# Altium footprint library Ryś_PCB.PcbLib: 22 footprints (part 1 of 2)
Each footprint in its own frame and in the unit in brackets; x right, y up, seen from the top. Pads: shape width x height; smd on the part's side, far side on the other; paste and mask are expansions set on the pad; w line width, h text height; cw(c..) or ccw(c..) is an arc to the next point about the centre after c.
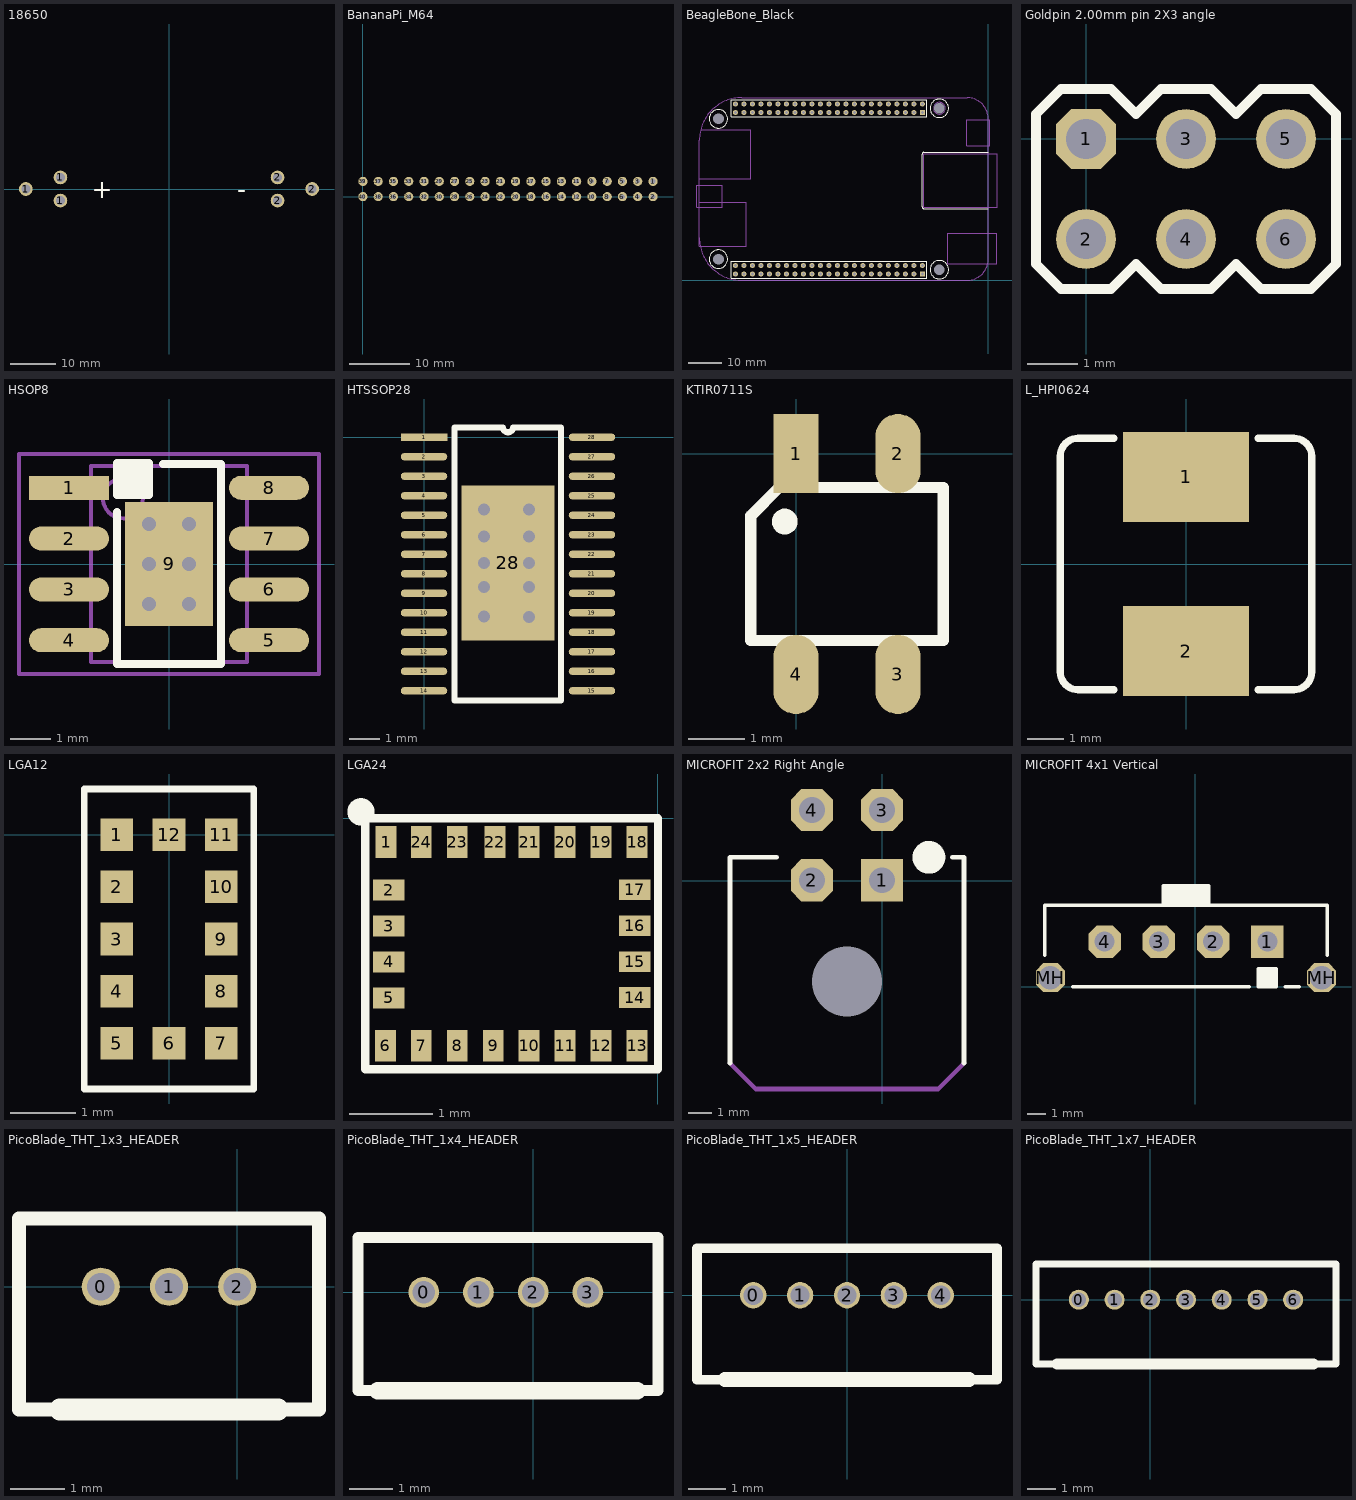
[diagram p0: the footprints below, top view; thin cyan lines are the x and y axes]

## 18650 [mm]
pads (6):
  round 3 hole 2: 1(-31.5,0) 1(-23.88,-2.54) 1(-23.88,2.54) 2(23.88,-2.54) 2(23.88,2.54) 2(31.5,0)
Top Overlay:
  text "+" at -17,-2 h4
  text "-" at 15,-2 h4
3D body "KEYELCO_54.STEP": height 18.16, standoff -3.05, extent 21.913,-9.444 34.92,9.443
3D body "KEYELCO_54.STEP": height 18.16, standoff -3.05, extent -34.92,-9.443 -21.913,9.444

## BananaPi_M64 [mil] "singleboard_computer_40PIN_header"
pads (40):
  round 60 hole 35: 1(1900,100)
  round 60 hole 30: 2(1900,0) 3(1800,100) 4(1800,0) 5(1700,100) 6(1700,0) 7(1600,100) 8(1600,0) 9(1500,100) 10(1500,0) 11(1400,100) 12(1400,0) 13(1300,100) 14(1300,0) 15(1200,100) 16(1200,0) 17(1100,100) 18(1100,0) 19(1000,100) 20(1000,0) 21(900,100) 22(900,0) 23(800,100) 24(800,0) 25(700,100) 26(700,0) 27(600,100) 28(600,0) 29(500,100) 30(500,0) 31(400,100) 32(400,0) 33(300,100) 34(300,0) 35(200,100) 36(200,0) 37(100,100) 38(100,0) 39(0,100) 40(0,0)
Bottom Overlay:
  circle w19.68: c0.16,0.1 r32.5
  circle w19.68: c0.16,100.1 r32.5
  circle w19.68: c100.16,0.1 r32.5
  circle w19.68: c100.16,100.1 r32.5
  circle w19.68: c200.16,0.1 r32.5
  circle w19.68: c200.16,100.1 r32.5
  circle w19.68: c300.16,0.1 r32.5
  circle w19.68: c300.16,100.1 r32.5
  circle w19.68: c400.16,0.1 r32.5
  circle w19.68: c400.16,100.1 r32.5
  circle w19.68: c500.16,0.1 r32.5
  circle w19.68: c500.16,100.1 r32.5
  circle w19.68: c600.16,0.1 r32.5
  circle w19.68: c600.16,100.1 r32.5
  circle w19.68: c700.16,0.1 r32.5
  circle w19.68: c700.16,100.1 r32.5
  circle w19.68: c800.16,0.1 r32.5
  circle w19.68: c800.16,100.1 r32.5
  circle w19.68: c900.16,0.1 r32.5
  circle w19.68: c900.16,100.1 r32.5
  circle w19.68: c1000.16,0.1 r32.5
  circle w19.68: c1000.16,100.1 r32.5
  circle w19.68: c1100.16,0.1 r32.5
  circle w19.68: c1100.16,100.1 r32.5
  circle w19.68: c1200.16,0.1 r32.5
  circle w19.68: c1200.16,100.1 r32.5
  circle w19.68: c1300.16,0.1 r32.5
  circle w19.68: c1300.16,100.1 r32.5
  circle w19.68: c1400.16,0.1 r32.5
  circle w19.68: c1400.16,100.1 r32.5
  circle w19.68: c1500.16,0.1 r32.5
  circle w19.68: c1500.16,100.1 r32.5
  circle w19.68: c1600.16,0.1 r32.5
  circle w19.68: c1600.16,100.1 r32.5
  circle w19.68: c1700.16,0.1 r32.5
  circle w19.68: c1700.16,100.1 r32.5
  circle w19.68: c1800.16,0.1 r32.5
  circle w19.68: c1800.16,100.1 r32.5
  circle w19.68: c1900.16,0.1 r32.5
  lines w19.68: 1867.66,67.6 1932.66,67.6 1932.66,132.6 1867.66,132.6 1867.66,67.6
3D body "bpi-m64.STEP": height 195.91, standoff -592.14, extent -1308.33,-125.17 2527.56,2345.64
3D body "User Library-PBD2_54-40.step": height 92.52, standoff -344.49, extent -49.21,-49.21 1950.79,150.79

## BeagleBone_Black [mm]
pads (96):
  round 2 hole 3.2 unplated: MH(-80.645,6.35) MH(-80.645,48.26) MH(-14.605,3.175) MH(-14.605,51.435)
  rect 1.5x1.5 hole 0.9 mask+0.051: P8_1(-19.685,50.165) P9_1(-19.685,1.905)
  round 1.5 hole 0.9 mask+0.051: P8_2(-19.685,52.705) P8_3(-22.225,50.165) P8_4(-22.225,52.705) P8_5(-24.765,50.165) P8_6(-24.765,52.705) P8_7(-27.305,50.165) P8_8(-27.305,52.705) P8_9(-29.845,50.165) P8_10(-29.845,52.705) P8_11(-32.385,50.165) P8_12(-32.385,52.705) P8_13(-34.925,50.165) P8_14(-34.925,52.705) P8_15(-37.465,50.165) P8_16(-37.465,52.705) P8_17(-40.005,50.165) P8_18(-40.005,52.705) P8_19(-42.545,50.165) P8_20(-42.545,52.705) P8_21(-45.085,50.165) P8_22(-45.085,52.705) P8_23(-47.625,50.165) P8_24(-47.625,52.705) P8_25(-50.165,50.165) P8_26(-50.165,52.705) P8_27(-52.705,50.165) P8_28(-52.705,52.705) P8_29(-55.245,50.165) P8_30(-55.245,52.705) P8_31(-57.785,50.165) P8_32(-57.785,52.705) P8_33(-60.325,50.165) P8_34(-60.325,52.705) P8_35(-62.865,50.165) P8_36(-62.865,52.705) P8_37(-65.405,50.165) P8_38(-65.405,52.705) P8_39(-67.945,50.165) P8_40(-67.945,52.705) P8_41(-70.485,50.165) P8_42(-70.485,52.705) P8_43(-73.025,50.165) P8_44(-73.025,52.705) P8_45(-75.565,50.165) P8_46(-75.565,52.705) P9_2(-19.685,4.445) P9_3(-22.225,1.905) P9_4(-22.225,4.445) P9_5(-24.765,1.905) P9_6(-24.765,4.445) P9_7(-27.305,1.905) P9_8(-27.305,4.445) P9_9(-29.845,1.905) P9_10(-29.845,4.445) P9_11(-32.385,1.905) P9_12(-32.385,4.445) P9_13(-34.925,1.905) P9_14(-34.925,4.445) P9_15(-37.465,1.905) P9_16(-37.465,4.445) P9_17(-40.005,1.905) P9_18(-40.005,4.445) P9_19(-42.545,1.905) P9_20(-42.545,4.445) P9_21(-45.085,1.905) P9_22(-45.085,4.445) P9_23(-47.625,1.905) P9_24(-47.625,4.445) P9_25(-50.165,1.905) P9_26(-50.165,4.445) P9_27(-52.705,1.905) P9_28(-52.705,4.445) P9_29(-55.245,1.905) P9_30(-55.245,4.445) P9_31(-57.785,1.905) P9_32(-57.785,4.445) P9_33(-60.325,1.905) P9_34(-60.325,4.445) P9_35(-62.865,1.905) P9_36(-62.865,4.445) P9_37(-65.405,1.905) P9_38(-65.405,4.445) P9_39(-67.945,1.905) P9_40(-67.945,4.445) P9_41(-70.485,1.905) P9_42(-70.485,4.445) P9_43(-73.025,1.905) P9_44(-73.025,4.445) P9_45(-75.565,1.905) P9_46(-75.565,4.445)
Top Overlay:
  circle w0.2: c-14.605,3.175 r2.75
  circle w0.2: c-80.645,6.35 r2.75
  circle w0.2: c-80.645,48.26 r2.75
  circle w0.2: c-14.605,51.435 r2.75
  lines w0.025: -76.835,0.635 -76.835,5.715 -20.955,5.715 -18.415,5.715 -18.415,0.635 -20.955,0.635 -76.835,0.635 ; -76.835,48.895 -76.835,53.975 -20.955,53.975 -18.415,53.975 -18.415,48.895 -20.955,48.895 -76.835,48.895
  lines w0.1: 0,21.44 -19.25,21.44 cw(c-19.25,21.94) -19.75,21.94 -19.75,37.75 cw(c-19.25,37.75) -19.25,38.25 0,38.25
Bottom Overlay:
  circle w0.2: c-80.645,48.26 r2.75
  circle w0.2: c-80.645,6.35 r2.75
  circle w0.2: c-14.605,3.175 r2.75
  circle w0.2: c-14.605,51.435 r2.75
  text ".Designator" at -79.057,2.54 h1.02
  text ".Designator" at -79.057,50.8 h1.02
Top Solder:
  circle w2.5: c-14.605,3.175 r1.25
  circle w2.5: c-80.645,6.35 r1.25
  circle w2.5: c-80.645,48.26 r1.25
  circle w2.5: c-14.605,51.435 r1.25
Bottom Solder:
  circle w2.5: c-80.645,48.26 r1.25
  circle w2.5: c-80.645,6.35 r1.25
  circle w2.5: c-14.605,3.175 r1.25
  circle w2.5: c-14.605,51.435 r1.25
Mechanical 9:
  circle w0.005: c-14.605,51.435 r1.75
Mechanical 13:
  lines w0.1: -86.294,30.416 -70.991,30.416 -70.991,45.021 -85.901,45.021 ; -12.065,4.953 -12.065,14.097 ; -12.065,4.953 -0.25,4.953 2.54,4.953 2.54,14.097 0,14.097 ; -12.065,4.953 -12.065,14.097 ; -12.065,14.097 0,14.097 ; -12.065,14.097 0,14.097 ; -87.05,21.896 -87.05,28.396 -79.55,28.396 -79.55,21.896 -87.05,21.896 ; -86.36,12.7 ccw(c-73.66,12.7) -73.66,0 -6.35,0 ccw(c-6.35,6.35) 0,6.35 0,48.26 ccw(c-6.35,48.26) -6.35,54.61 -73.66,54.61 ccw(c-73.66,41.91) -86.36,41.91 -86.36,12.7 ; -86.332,10.264 -72.332,10.264 -72.332,23.365 -86.332,23.365 -86.332,10.264 ; -19.228,21.895 0,21.895 2.616,21.895 2.616,37.795 0,37.795 -19.228,37.795 -19.228,21.895 ; -6.496,40.283 -6.496,47.982 0.504,47.982 0.504,40.283 -6.496,40.283
Multi-Layer:
  drawing of 4 lines, arcs and shapes, not listed
3D body: height 1.5, standoff 0, extent -71.755,0.635 -69.215,5.715
3D body: height 8.6, standoff -3, extent -70.739,4.191 -70.231,4.699
3D body: height 8.6, standoff -3, extent -70.739,1.651 -70.231,2.159
3D body: height 1.5, standoff 0, extent -74.295,0.635 -71.755,5.715
3D body: height 8.6, standoff -3, extent -73.279,4.191 -72.771,4.699
3D body: height 8.6, standoff -3, extent -73.279,1.651 -72.771,2.159
3D body: height 1.5, standoff 0, extent -76.835,0.635 -74.295,5.715
3D body: height 8.6, standoff -3, extent -75.819,4.191 -75.311,4.699
3D body: height 8.6, standoff -3, extent -75.819,1.651 -75.311,2.159
3D body: height 1.5, standoff 0, extent -61.595,0.635 -59.055,5.715
3D body: height 8.6, standoff -3, extent -60.579,4.191 -60.071,4.699
3D body: height 8.6, standoff -3, extent -60.579,1.651 -60.071,2.159
3D body: height 1.5, standoff 0, extent -64.135,0.635 -61.595,5.715
3D body: height 8.6, standoff -3, extent -63.119,4.191 -62.611,4.699
3D body: height 8.6, standoff -3, extent -63.119,1.651 -62.611,2.159
3D body: height 1.5, standoff 0, extent -66.675,0.635 -64.135,5.715
3D body: height 8.6, standoff -3, extent -65.659,4.191 -65.151,4.699
3D body: height 8.6, standoff -3, extent -65.659,1.651 -65.151,2.159
3D body: height 1.5, standoff 0, extent -69.215,0.635 -66.675,5.715
3D body: height 8.6, standoff -3, extent -68.199,4.191 -67.691,4.699
3D body: height 8.6, standoff -3, extent -68.199,1.651 -67.691,2.159
3D body: height 1.5, standoff 0, extent -51.435,0.635 -48.895,5.715
3D body: height 8.6, standoff -3, extent -50.419,4.191 -49.911,4.699
3D body: height 8.6, standoff -3, extent -50.419,1.651 -49.911,2.159
3D body: height 1.5, standoff 0, extent -53.975,0.635 -51.435,5.715
3D body: height 8.6, standoff -3, extent -52.959,4.191 -52.451,4.699
3D body: height 8.6, standoff -3, extent -52.959,1.651 -52.451,2.159
3D body: height 1.5, standoff 0, extent -56.515,0.635 -53.975,5.715
3D body: height 8.6, standoff -3, extent -55.499,4.191 -54.991,4.699
3D body: height 8.6, standoff -3, extent -55.499,1.651 -54.991,2.159
3D body: height 1.5, standoff 0, extent -59.055,0.635 -56.515,5.715
3D body: height 8.6, standoff -3, extent -58.039,4.191 -57.531,4.699
3D body: height 8.6, standoff -3, extent -58.039,1.651 -57.531,2.159
3D body: height 1.5, standoff 0, extent -41.275,0.635 -38.735,5.715
3D body: height 8.6, standoff -3, extent -40.259,4.191 -39.751,4.699
3D body: height 8.6, standoff -3, extent -40.259,1.651 -39.751,2.159
3D body: height 1.5, standoff 0, extent -43.815,0.635 -41.275,5.715
3D body: height 8.6, standoff -3, extent -42.799,4.191 -42.291,4.699
3D body: height 8.6, standoff -3, extent -42.799,1.651 -42.291,2.159
3D body: height 1.5, standoff 0, extent -46.355,0.635 -43.815,5.715
3D body: height 8.6, standoff -3, extent -45.339,4.191 -44.831,4.699
3D body: height 8.6, standoff -3, extent -45.339,1.651 -44.831,2.159
3D body: height 1.5, standoff 0, extent -48.895,0.635 -46.355,5.715
3D body: height 8.6, standoff -3, extent -47.879,4.191 -47.371,4.699
3D body: height 8.6, standoff -3, extent -47.879,1.651 -47.371,2.159
3D body: height 1.5, standoff 0, extent -31.115,0.635 -28.575,5.715
3D body: height 8.6, standoff -3, extent -30.099,4.191 -29.591,4.699
3D body: height 8.6, standoff -3, extent -30.099,1.651 -29.591,2.159
3D body: height 1.5, standoff 0, extent -33.655,0.635 -31.115,5.715
3D body: height 8.6, standoff -3, extent -32.639,4.191 -32.131,4.699
3D body: height 8.6, standoff -3, extent -32.639,1.651 -32.131,2.159
3D body: height 1.5, standoff 0, extent -36.195,0.635 -33.655,5.715
3D body: height 8.6, standoff -3, extent -35.179,4.191 -34.671,4.699
3D body: height 8.6, standoff -3, extent -35.179,1.651 -34.671,2.159
3D body: height 1.5, standoff 0, extent -38.735,0.635 -36.195,5.715
3D body: height 8.6, standoff -3, extent -37.719,4.191 -37.211,4.699
3D body: height 8.6, standoff -3, extent -37.719,1.651 -37.211,2.159
3D body: height 8.6, standoff -3, extent -27.559,1.651 -27.051,2.159
3D body: height 8.6, standoff -3, extent -27.559,4.191 -27.051,4.699
3D body: height 1.5, standoff 0, extent -28.575,0.635 -26.035,5.715
3D body: height 8.6, standoff -3, extent -25.019,1.651 -24.511,2.159
3D body: height 8.6, standoff -3, extent -25.019,4.191 -24.511,4.699
3D body: height 1.5, standoff 0, extent -26.035,0.635 -23.495,5.715
3D body: height 8.6, standoff -3, extent -22.479,1.651 -21.971,2.159
3D body: height 8.6, standoff -3, extent -22.479,4.191 -21.971,4.699
3D body: height 1.5, standoff 0, extent -23.495,0.635 -20.955,5.715
3D body: height 8.6, standoff -3, extent -19.939,1.651 -19.431,2.159
3D body: height 8.6, standoff -3, extent -19.939,4.191 -19.431,4.699
3D body: height 1.5, standoff 0, extent -20.955,0.635 -18.415,5.715
3D body "BEAGLEBONE_BLACK.STEP": height 2.84, standoff -16.53, extent -87.947,-0.003 2.503,54.657
3D body: height 1.5, standoff 0, extent -20.955,48.895 -18.415,53.975
3D body: height 8.6, standoff -3, extent -19.939,52.451 -19.431,52.959
3D body: height 8.6, standoff -3, extent -19.939,49.911 -19.431,50.419
3D body: height 1.5, standoff 0, extent -23.495,48.895 -20.955,53.975
3D body: height 8.6, standoff -3, extent -22.479,52.451 -21.971,52.959
3D body: height 8.6, standoff -3, extent -22.479,49.911 -21.971,50.419
3D body: height 1.5, standoff 0, extent -26.035,48.895 -23.495,53.975
3D body: height 8.6, standoff -3, extent -25.019,52.451 -24.511,52.959
3D body: height 8.6, standoff -3, extent -25.019,49.911 -24.511,50.419
3D body: height 1.5, standoff 0, extent -28.575,48.895 -26.035,53.975
3D body: height 8.6, standoff -3, extent -27.559,52.451 -27.051,52.959
3D body: height 8.6, standoff -3, extent -27.559,49.911 -27.051,50.419
3D body: height 8.6, standoff -3, extent -37.719,49.911 -37.211,50.419
3D body: height 8.6, standoff -3, extent -37.719,52.451 -37.211,52.959
3D body: height 1.5, standoff 0, extent -38.735,48.895 -36.195,53.975
3D body: height 8.6, standoff -3, extent -35.179,49.911 -34.671,50.419
3D body: height 8.6, standoff -3, extent -35.179,52.451 -34.671,52.959
3D body: height 1.5, standoff 0, extent -36.195,48.895 -33.655,53.975
3D body: height 8.6, standoff -3, extent -32.639,49.911 -32.131,50.419
3D body: height 8.6, standoff -3, extent -32.639,52.451 -32.131,52.959
3D body: height 1.5, standoff 0, extent -33.655,48.895 -31.115,53.975
3D body: height 8.6, standoff -3, extent -30.099,49.911 -29.591,50.419
3D body: height 8.6, standoff -3, extent -30.099,52.451 -29.591,52.959
3D body: height 1.5, standoff 0, extent -31.115,48.895 -28.575,53.975
3D body: height 8.6, standoff -3, extent -47.879,49.911 -47.371,50.419
3D body: height 8.6, standoff -3, extent -47.879,52.451 -47.371,52.959
3D body: height 1.5, standoff 0, extent -48.895,48.895 -46.355,53.975
3D body: height 8.6, standoff -3, extent -45.339,49.911 -44.831,50.419
3D body: height 8.6, standoff -3, extent -45.339,52.451 -44.831,52.959
3D body: height 1.5, standoff 0, extent -46.355,48.895 -43.815,53.975
3D body: height 8.6, standoff -3, extent -42.799,49.911 -42.291,50.419
3D body: height 8.6, standoff -3, extent -42.799,52.451 -42.291,52.959
3D body: height 1.5, standoff 0, extent -43.815,48.895 -41.275,53.975
3D body: height 8.6, standoff -3, extent -40.259,49.911 -39.751,50.419
3D body: height 8.6, standoff -3, extent -40.259,52.451 -39.751,52.959
3D body: height 1.5, standoff 0, extent -41.275,48.895 -38.735,53.975
3D body: height 8.6, standoff -3, extent -58.039,49.911 -57.531,50.419
3D body: height 8.6, standoff -3, extent -58.039,52.451 -57.531,52.959
3D body: height 1.5, standoff 0, extent -59.055,48.895 -56.515,53.975
3D body: height 8.6, standoff -3, extent -55.499,49.911 -54.991,50.419
3D body: height 8.6, standoff -3, extent -55.499,52.451 -54.991,52.959
3D body: height 1.5, standoff 0, extent -56.515,48.895 -53.975,53.975
3D body: height 8.6, standoff -3, extent -52.959,49.911 -52.451,50.419
3D body: height 8.6, standoff -3, extent -52.959,52.451 -52.451,52.959
3D body: height 1.5, standoff 0, extent -53.975,48.895 -51.435,53.975
3D body: height 8.6, standoff -3, extent -50.419,49.911 -49.911,50.419
3D body: height 8.6, standoff -3, extent -50.419,52.451 -49.911,52.959
3D body: height 1.5, standoff 0, extent -51.435,48.895 -48.895,53.975
3D body: height 8.6, standoff -3, extent -68.199,49.911 -67.691,50.419
3D body: height 8.6, standoff -3, extent -68.199,52.451 -67.691,52.959
3D body: height 1.5, standoff 0, extent -69.215,48.895 -66.675,53.975
3D body: height 8.6, standoff -3, extent -65.659,49.911 -65.151,50.419
3D body: height 8.6, standoff -3, extent -65.659,52.451 -65.151,52.959
3D body: height 1.5, standoff 0, extent -66.675,48.895 -64.135,53.975
3D body: height 8.6, standoff -3, extent -63.119,49.911 -62.611,50.419
3D body: height 8.6, standoff -3, extent -63.119,52.451 -62.611,52.959
3D body: height 1.5, standoff 0, extent -64.135,48.895 -61.595,53.975
3D body: height 8.6, standoff -3, extent -60.579,49.911 -60.071,50.419
3D body: height 8.6, standoff -3, extent -60.579,52.451 -60.071,52.959
3D body: height 1.5, standoff 0, extent -61.595,48.895 -59.055,53.975
3D body: height 8.6, standoff -3, extent -75.819,49.911 -75.311,50.419
3D body: height 8.6, standoff -3, extent -75.819,52.451 -75.311,52.959
3D body: height 1.5, standoff 0, extent -76.835,48.895 -74.295,53.975
3D body: height 8.6, standoff -3, extent -73.279,49.911 -72.771,50.419
3D body: height 8.6, standoff -3, extent -73.279,52.451 -72.771,52.959
3D body: height 1.5, standoff 0, extent -74.295,48.895 -71.755,53.975
3D body: height 8.6, standoff -3, extent -70.739,49.911 -70.231,50.419
3D body: height 8.6, standoff -3, extent -70.739,52.451 -70.231,52.959
3D body: height 1.5, standoff 0, extent -71.755,48.895 -69.215,53.975

## Goldpin 2.00mm pin 2X3 angle [mm]
pads (6):
  oct 1.2x1.2 hole 0.8: 1(0,0)
  round 1.2 hole 0.8: 2(0,-2) 3(2,0) 4(2,-2) 5(4,0) 6(4,-2)
Top Overlay:
  lines w0.2: -1,-2.5 -0.5,-3 0.5,-3 1,-2.5 1.5,-3 2.5,-3 3,-2.5 3.5,-3 4.5,-3 5,-2.5 5,0.5 4.5,1 3.5,1 3,0.5 2.5,1 1.5,1 1,0.5 0.5,1 -0.5,1 -1,0.5 -1,-2.5
3D body "47351.stp": height 3.91, standoff -2.69, extent -0.962,-2.3 5.038,5.7

## HSOP8 [mm] "H pad 8-Pin Small Outline Integrated Circuit 1.27 mm Pitch, IPC Medium Density"
height 1.75
pads (9):
  rect 2x0.6 smd: 1(-2.5,1.905)
  oval 2x0.6 smd: 2(-2.5,0.635) 3(-2.5,-0.635) 4(-2.5,-1.905) 5(2.5,-1.905) 6(2.5,-0.635) 7(2.5,0.635) 8(2.5,1.905)
  rect 2.2x3.1 smd: 9(0,0)
via -0.5,-1 diameter 0.35 hole 0.35
via 0.5,-1 diameter 0.35 hole 0.35
via 0.5,0 diameter 0.35 hole 0.35
via -0.5,0 diameter 0.35 hole 0.35
via -0.5,1 diameter 0.35 hole 0.35
via 0.5,1 diameter 0.35 hole 0.35
Top Overlay:
  rectangle: -1.3,1.725 -0.5,2.525
  lines w0.2: -1.3,1.3 -1.3,-2.5 1.3,-2.5 1.3,2.5 -0.15,2.5 ; -1.3,1.725 -0.5,1.725 -0.5,2.525 -1.3,2.525 -1.3,1.725
Mechanical 13:
  circle w0.1: c-1.15,1.64 r0.5
  lines w0.1: -1.95,-2.45 1.95,-2.45 1.95,2.45 -1.95,2.45 -1.95,-2.45
Mechanical 15:
  lines w0.1: -0.5,0 0.5,0 ; 0,-0.5 0,0.5 ; -3.75,-2.75 3.75,-2.75 3.75,2.75 -3.75,2.75 -3.75,-2.75
3D body "User Library-HSOP8.STEP": height 1.75, standoff 0, extent -3.1,-2.5 3.1,2.5

## HTSSOP28 [mm] "Stepper driver power pad package"
pads (29):
  rect 1.55x0.25 smd: 1(0,0)
  oval 1.55x0.25 smd: 2(0,-0.65) 3(0,-1.3) 4(0,-1.95) 5(0,-2.6) 6(0,-3.25) 7(0,-3.9) 8(0,-4.55) 9(0,-5.2) 10(0,-5.85) 11(0,-6.5) 12(0,-7.15) 13(0,-7.8) 14(0,-8.45) 15(5.6,-8.45) 16(5.6,-7.8) 17(5.6,-7.15) 18(5.6,-6.5) 19(5.6,-5.85) 20(5.6,-5.2) 21(5.6,-4.55) 22(5.6,-3.9) 23(5.6,-3.25) 24(5.6,-2.6) 25(5.6,-1.95) 26(5.6,-1.3) 27(5.6,-0.65) 28(5.6,0)
  rect 3.1x5.18 smd: 28(2.794,-4.191)
via 3.5,-2.413 diameter 0.4 hole 0.4
via 2,-2.413 diameter 0.4 hole 0.4
via 3.5,-3.302 diameter 0.4 hole 0.4
via 2,-3.302 diameter 0.4 hole 0.4
via 3.5,-4.191 diameter 0.4 hole 0.4
via 2,-4.191 diameter 0.4 hole 0.4
via 3.5,-5 diameter 0.4 hole 0.4
via 2,-5 diameter 0.4 hole 0.4
via 2,-5.969 diameter 0.4 hole 0.4
via 3.5,-6 diameter 0.4 hole 0.4
Top Overlay:
  lines w0.2: 1.016,-8.775 4.572,-8.775 4.572,0.325 2.962,0.325 cw(c2.8,0.325) 2.638,0.325 1.016,0.325 1.016,-8.775
3D body "User Library-PWP (R-PDSO-G28).STEP": height 1.2, standoff 0, extent -0.516,-9.091 6.104,0.709

## KTIR0711S [mm] "HIGH SENSITI  VITY PHOTOINTERRUPTER"
pads (4):
  rect 0.8x1.4 smd: 1(0,0)
  oval 0.8x1.4 smd: 2(1.8,0) 3(1.8,-3.9) 4(0,-3.9)
Top Overlay:
  circle w0.254: c-0.2,-1.2 r0.1
  lines w0.2: -0.8,-3.3 2.6,-3.3 2.6,-0.6 -0.3,-0.6 -0.8,-1.1 -0.8,-3.3
3D body "User Library-ktir0711s-1.step": height 1.5, standoff 0, extent -0.8,-4.2 2.6,0.3

## L_HPI0624 [mm] "7.3mm x 7.3mm x 3.2mm"
height 2.2
pads (2):
  rect 3.5x2.5 smd: 1(0,2.425) 2(0,-2.425)
Top Overlay:
  lines w0.2: -2,-3.5 -3,-3.5 cw(c-3,-3) -3.5,-3 -3.5,3 cw(c-3,3) -3,3.5 -2,3.5 ; 2,-3.5 3,-3.5 ccw(c3,-3) 3.5,-3 3.5,3 ccw(c3,3) 3,3.5 2,3.5
3D body "45543.stp": height 3.2, standoff 0, extent -3.65,-3.65 3.65,3.65

## LGA12 [mm]
pads (12):
  rect 0.5x0.5 smd: 1(-0.8,0) 2(-0.8,-0.8) 3(-0.8,-1.6) 4(-0.8,-2.4) 5(-0.8,-3.2) 6(0,-3.2) 7(0.8,-3.2) 8(0.8,-2.4) 9(0.8,-1.6) 10(0.8,-0.8) 11(0.8,0) 12(0,0)
Top Overlay:
  lines w0.1: -1.3,-3.9 -1.3,0.7 1.3,0.7 1.3,-3.9 -1.3,-3.9
3D body: height 1.05, standoff 0, extent -1.3,-3.9 1.3,0.7
3D body: height 1.1, standoff 0, extent -0.198,-0.7 0.2,-0.3
3D body: height 1.1, standoff 0, extent -0.198,-2.7 0.2,-2.3

## LGA24 [mm]
pads (24):
  rect 0.25x0.38 smd mask+0.05: 1(-3.25,-0.285) 6(-3.26,-2.721) 7(-2.83,-2.721) 8(-2.4,-2.721) 9(-1.97,-2.721) 10(-1.54,-2.721) 11(-1.11,-2.721) 12(-0.68,-2.721) 13(-0.25,-2.721) 18(-0.25,-0.285) 19(-0.68,-0.285) 20(-1.11,-0.285) 21(-1.54,-0.285) 22(-1.95,-0.285) 23(-2.4,-0.285) 24(-2.83,-0.285)
  rect 0.38x0.25 smd mask+0.05: 2(-3.22,-0.859) 3(-3.22,-1.289) 4(-3.22,-1.719) 5(-3.22,-2.149) 14(-0.279,-2.146) 15(-0.279,-1.716) 16(-0.279,-1.286) 17(-0.279,-0.856)
Top Overlay:
  circle w0.254: c-3.551,0.076 r0.035
  lines w0.1: -3.5,-3 -3.5,0 0,0 0,-3 -3.5,-3
3D body "User Library-LGA-24L.step": height 0.87, standoff -0.13, extent -3.503,-3.001 -0.003,-0.001

## MICROFIT 2x2 Right Angle [mm] "Molex Right Angle 3.00mm pitch Micro-Fit 3.0 Wire-to-Board Header"
height 6
pads (5):
  rect 1.8x1.8 hole 1.1: 1(0,0.02)
  oct 1.8x1.8 hole 1.1: 2(-3,0.02) 3(0,3.02) 4(-3,3.02)
  rect 0x0 hole 3 unplated: MH(-1.5,-4.3)
Top Overlay:
  circle w1: c2,1 r0.2
  lines w0.2: -6.5,-7.8 -6.5,1 -4.5,1 ; 3,1 3.5,1 3.5,-7.8
Mechanical 13:
  lines w0.2: -6.5,-7.8 -5.4,-8.9 2.4,-8.9 3.5,-7.8
3D body "430450400.stp": height 8.83, standoff -3.12, extent -6.55,-9.02 3.6,3.22

## MICROFIT 4x1 Vertical [mm] "Molex Vertical 3.00mm pitch Micro-Fit 3.0 Wire-to-Board Header 436500429"
pads (6):
  rect 1.8x1.8 hole 1.1: 1(4,2.5)
  oct 1.8x1.8 hole 1.1: 2(1,2.5) 3(-2,2.5) 4(-5,2.5)
  oct 1.6x1.6 hole 1.3: MH(-8,0.5) MH(7,0.5)
Top Overlay:
  region: 0.75,5.58 -1.75,5.58 -1.75,4.58 0.75,4.58
  region: 4.5,1 3.5,1 3.5,0 4.5,0
  lines w0.2: -8.325,1.75 -8.325,4.5 -2,4.5 7.325,4.5 7.325,1.75 ; -6.75,0 3,0 ; -1.75,4.58 -1.75,5.58 0.75,5.58 0.75,4.6 ; 5,0 5.75,0 ; 3.5,0 3.5,1 4.5,1 4.5,0 3.5,0
3D body "436500429.stp": height 9.95, standoff -3.13, extent -8.325,0.095 7.325,5.7

## PicoBlade_THT_1x3_HEADER [mm]
pads (3):
  round 0.7 hole 0.51: 0(-2.5,0) 1(-1.25,0) 2(0,0)
Top Overlay:
  lines w0.254: -4,-2.25 -4,1.25 1.5,1.25 1.5,-2.25 -4,-2.25
  lines w0.4: -3.25,-2.25 0.75,-2.25
3D body "User Library-53047-0310.step": height 4.25, standoff -2.25, extent -4,-2.25 1.5,1.25
3D body: height 0.25, standoff -8, extent 2.75,0.75 2.75,0.75
3D body: height 0.25, standoff -8, extent -0.75,2.25 -0.75,2.25
3D body: height 0.25, standoff -8, extent -4,2.5 -4,2.5

## PicoBlade_THT_1x4_HEADER [mm]
pads (4):
  round 0.7 hole 0.51: 0(-2.5,0) 1(-1.25,0) 2(0,0) 3(1.25,0)
Top Overlay:
  lines w0.254: -4,-2.25 2.85,-2.25 2.85,1.25 -4,1.25 -4,-2.25
  lines w0.4: -3.55,-2.25 2.375,-2.25
3D body "User Library-53047-0410.step": height 4, standoff -2.5, extent -3.95,-2.2 2.8,1.3

## PicoBlade_THT_1x5_HEADER [mm]
pads (5):
  round 0.7 hole 0.51: 0(-2.5,0) 1(-1.25,0) 2(0,0) 3(1.25,0) 4(2.5,0)
Top Overlay:
  lines w0.254: -4,-2.25 -4,1.25 4,1.25 4,-2.25 -4,-2.25
  lines w0.4: -3.25,-2.25 3.25,-2.25
3D body "User Library-53047-0510.step": height 4.25, standoff -2.25, extent -4,-2.25 4,1.25

## PicoBlade_THT_1x7_HEADER [mm]
pads (7):
  round 0.7 hole 0.51: 0(-2.5,0) 1(-1.25,0) 2(0,0) 3(1.25,0) 4(2.5,0) 5(3.75,0) 6(5,0)
Top Overlay:
  lines w0.254: -4,-2.25 -4,1.25 6.5,1.25 6.5,-2.25 -4,-2.25
  lines w0.4: -3.25,-2.25 5.7,-2.25
3D body "User Library-53047-0710.step": height 4.2, standoff -2.3, extent -3.95,-2.2 6.55,1.3